# Altium footprint library LimeMicroAltiumLib.PcbLib: 769 footprints (part 17 of 50)
Each footprint in its own frame and in the unit in brackets; x right, y up, seen from the top. Pads: shape width x height; smd on the part's side, far side on the other; paste and mask are expansions set on the pad; w line width, h text height; cw(c..) or ccw(c..) is an arc to the next point about the centre after c.
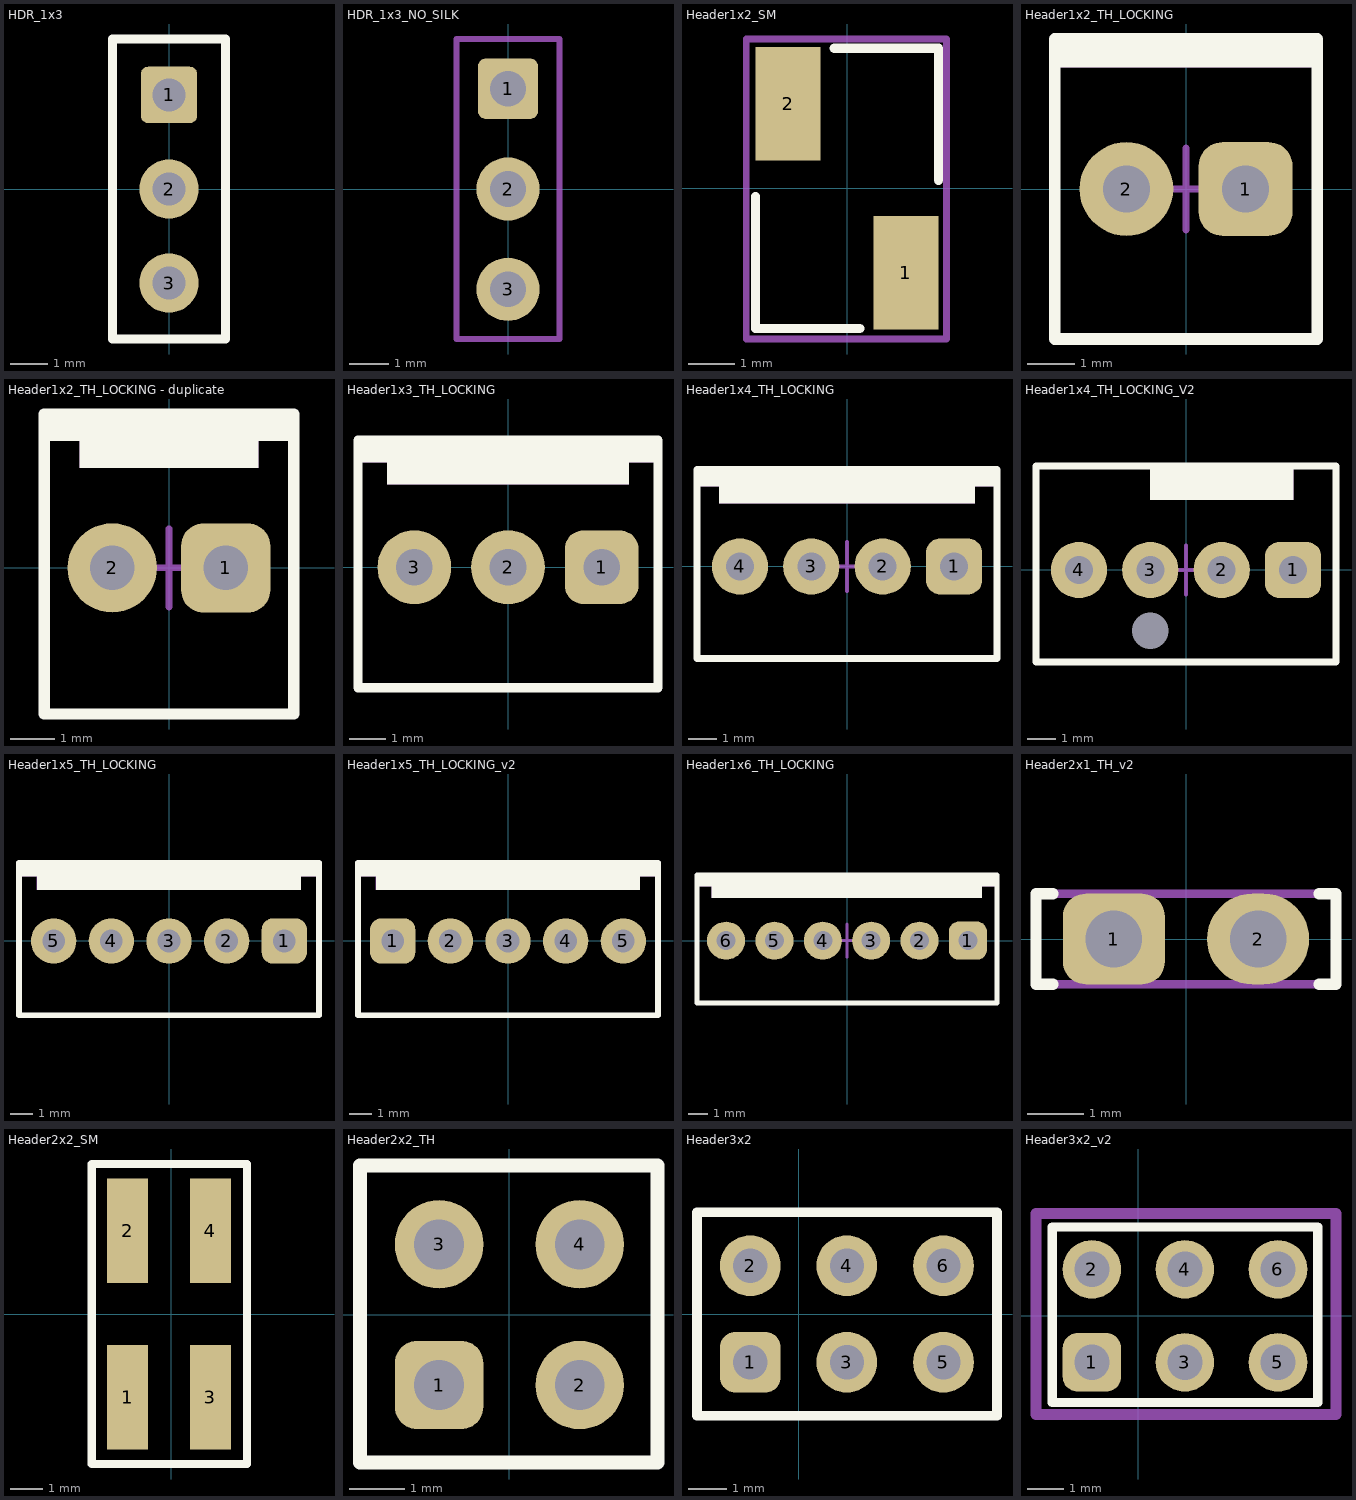
[diagram p16: the footprints below, top view; thin cyan lines are the x and y axes]

## HDR_1x3 [mm]
pads (3):
  rrect25% 1.524x1.524 hole 0.9: 1(0,2.54)
  round 1.6 hole 0.9: 2(0,0) 3(0,-2.54)
Top Overlay:
  lines w0.254: -1.525,-4.05 -1.525,4.05 1.525,4.05 1.525,-4.05 -1.525,-4.05
Mechanical 15:
  lines w0.15: -1.525,-4.05 -1.525,4.05 1.525,4.05 1.525,-4.05 -1.525,-4.05
  text ".Designator" at 0,0 h0.55
3D body "65775.stp": height 8.54, standoff -3, extent -1.27,-3.81 1.27,-1.27
3D body "65775.stp": height 8.54, standoff -3, extent -1.27,-1.27 1.27,1.27
3D body "65775.stp": height 8.54, standoff -3, extent -1.27,1.27 1.27,3.81

## HDR_1x3_NO_SILK [mm]
pads (3):
  rrect25% 1.524x1.524 hole 0.9: 1(0,2.54)
  round 1.6 hole 0.9: 2(0,0) 3(0,-2.54)
Mechanical 15:
  lines w0.15: -1.3,-3.8 1.3,-3.8 1.3,3.8 -1.3,3.8 -1.3,-3.8
  text ".Designator" at 0,0 h0.55
3D body "65775.stp": height 8.54, standoff -3, extent -1.27,1.27 1.27,3.81
3D body "65775.stp": height 8.54, standoff -3, extent -1.27,-1.27 1.27,1.27
3D body "65775.stp": height 8.54, standoff -3, extent -1.27,-3.81 1.27,-1.27

## Header1x2_SM [mm]
pads (2):
  rect 1.4x2.45 smd: 1(1.27,-1.825) 2(-1.27,1.825)
Top Overlay:
  lines w0.2: -1.975,-0.175 -1.975,-3.025 0.275,-3.025 ; -0.275,3.025 1.975,3.025 1.975,0.175
Mechanical 15:
  lines w0.15: -2.175,-3.25 -2.175,3.225 2.15,3.225 2.15,-3.25 -2.175,-3.25
  text ".Designator" at -0.05,0.175 h0.55

## Header1x2_TH_LOCKING [mm]
pads (2):
  rrect50% 2x2 hole 1: 1(1.271,0)
  round 2 hole 1: 2(-1.271,0)
Top Overlay:
  region: -2.8,3.2 -2.8,2.6 2.8,2.6 2.8,3.2
  lines w0.254: -2.8,-3.2 2.8,-3.2 2.8,3.2 -2.8,3.2 -2.8,-3.2
Mechanical 15:
  region: -2.8,3.2 -2.8,2.6 2.8,2.6 2.8,3.2
  lines w0.15: -0.875,0 0,0 ; 0,-0.875 0,0 ; 0,0.875 0,0 ; 0.875,0 0,0 ; -2.8,-3.2 -2.8,3.2 2.8,3.2 2.8,-3.2 -2.8,-3.2
  text ".Designator" at 0,0 h0.55
  text "KEY" at -0.7,1.8 h0.55
  text "1" at 1.125,-1 h0.55
3D body "022292021.stp": height 11.52, standoff -3.74, extent -2.54,-2.9 2.54,2.9

## Header1x2_TH_LOCKING - duplicate [mm]
pads (2):
  rrect50% 2x2 hole 1: 1(1.271,0)
  round 2 hole 1: 2(-1.271,0)
Top Overlay:
  region: 0,2.25 0,2.85 -2,2.85 -2,2.25
  region: 0,2.25 0,2.85 2,2.85 2,2.25
  region: -2.8,3.45 -2.8,2.85 2.8,2.85 2.8,3.45
  lines w0.254: -2.8,-3.275 2.8,-3.275 2.8,3.45 -2.8,3.45 -2.8,-3.275
Mechanical 15:
  region: -2,2.25 -2,2.85 2,2.85 2,2.25
  region: -2.8,3.45 -2.8,2.85 2.8,2.85 2.8,3.45
  lines w0.15: -0.875,0 0,0 ; 0,-0.875 0,0 ; 0,0.875 0,0 ; 0.875,0 0,0 ; -2.8,-3.275 -2.8,3.45 2.8,3.45 2.8,-3.275 -2.8,-3.275
  text ".Designator" at 0,0 h0.55
  text "KEY" at -0.675,1.475 h0.55
  text "1" at 1.125,-1 h0.55
3D body "022292021.stp": height 11.52, standoff -3.74, extent -2.54,-2.9 2.54,2.9

## Header1x3_TH_LOCKING [mm]
pads (3):
  rrect50% 2x2 hole 1: 1(2.543,0)
  round 2 hole 1: 2(0,0) 3(-2.543,0)
Top Overlay:
  region: -4.071,3.45 -4.071,2.85 4.071,2.85 4.071,3.45
  region: 0,2.25 0,2.85 3.271,2.85 3.271,2.25
  region: 0,2.25 0,2.85 -3.271,2.85 -3.271,2.25
  lines w0.254: -4.071,-3.275 -4.071,3.45 4.071,3.45 4.071,-3.275 -4.071,-3.275
Mechanical 15:
  region: 0,2.25 0,2.85 3.271,2.85 3.271,2.25
  region: -4.071,3.45 -4.071,2.85 4.071,2.85 4.071,3.45
  region: 0,2.25 0,2.85 -3.271,2.85 -3.271,2.25
  lines w0.15: -4.071,-3.275 -4.071,3.45 4.071,3.45 4.071,-3.275 -1.529,-3.275 ; -0.875,0 0,0 ; 0,-0.875 0,0 ; 0,0.875 0,0 ; 0.875,0 0,0
  text ".Designator" at 0,0 h0.55
  text "KEY" at -0.7,1.475 h0.55
  text "1" at 2.396,-1 h0.55
3D body "022292021.stp": height 11.52, standoff -3.74, extent -3.811,-2.9 1.269,2.9
3D body "022292021.stp": height 11.52, standoff -3.74, extent -1.268,-2.9 3.812,2.9

## Header1x4_TH_LOCKING [mm]
pads (4):
  rrect50% 2x2 hole 1: 1(3.814,0)
  round 2 hole 1: 2(1.271,0) 3(-1.271,0) 4(-3.814,0)
Top Overlay:
  region: 4.543,2.25 4.543,2.85 -4.554,2.85 -4.554,2.25
  region: -5.343,3.45 -5.343,2.85 5.343,2.85 5.343,3.45
  lines w0.254: -5.343,-3.275 5.343,-3.275 5.343,3.45 -5.343,3.45 -5.343,-3.275
Mechanical 15:
  region: 4.546,2.25 4.546,2.85 -4.554,2.85 -4.554,2.25
  region: -5.343,3.45 -5.343,2.85 5.343,2.85 5.343,3.45
  lines w0.15: -0.875,0 0,0 ; 0,-0.875 0,0 ; 0,0.875 0,0 ; 0.875,0 0,0 ; -5.343,-3.275 5.343,-3.275 5.343,3.45 -5.343,3.45 -5.343,-3.275
  text ".Designator" at 0,0 h0.55
  text "KEY" at -0.7,1.475 h0.55
  text "1" at 3.668,-1 h0.55
3D body "022292021.stp": height 11.52, standoff -3.74, extent 0.003,-2.9 5.083,2.9
3D body "022292021.stp": height 11.52, standoff -3.74, extent -2.54,-2.9 2.54,2.9
3D body "022292021.stp": height 11.52, standoff -3.74, extent -5.083,-2.9 -0.003,2.9

## Header1x4_TH_LOCKING_V2 [mm]
pads (5):
  round 0.25 hole 1.3 unplated mask+0.05: 0(-1.271,-2.16)
  rrect50% 2x2 hole 1: 1(3.814,0)
  round 2 hole 1: 2(1.271,0) 3(-1.271,0) 4(-3.814,0)
Top Overlay:
  region: 3.814,2.5 3.814,3.7 -1.271,3.7 -1.271,2.5
  lines w0.254: -5.343,-3.275 -5.343,3.7 5.343,3.7 5.343,-3.275 -5.343,-3.275
Mechanical 15:
  region: 3.814,2.5 3.814,3.7 -1.271,3.7 -1.271,2.5
  lines w0.15: -0.875,0 0,0 ; 0,-0.875 0,0 ; 0,0.875 0,0 ; 0.875,0 0,0 ; -5.343,-3.275 -5.343,3.7 5.343,3.7 5.343,-3.275 -5.343,-3.275
  text "1" at 3.668,-1 h0.55
  text "KEY" at 0.575,1.725 h0.55
  text ".Designator" at 0,0 h0.55
3D body "470533000.stp": height 9.84, standoff -4, extent -5.1,-2.54 5.1,3.3

## Header1x5_TH_LOCKING [mm]
pads (5):
  rrect50% 2x2 hole 1: 1(5.086,0)
  round 2 hole 1: 2(2.543,0) 3(0,0) 4(-2.543,0) 5(-5.086,0)
Top Overlay:
  region: -6.614,3.45 -6.614,2.85 6.614,2.85 6.614,3.45
  region: 5.814,2.25 5.814,2.85 -5.814,2.85 -5.814,2.25
  lines w0.254: -6.614,-3.275 -6.614,3.45 6.614,3.45 6.614,-3.275 -6.614,-3.275
Mechanical 15:
  region: -6.614,3.45 -6.614,2.85 6.614,2.85 6.614,3.45
  region: 5.818,2.25 5.818,2.85 -5.829,2.85 -5.829,2.25
  lines w0.15: -0.875,0 0,0 ; 0,-0.875 0,0 ; 0,0.875 0,0 ; 0.875,0 0,0 ; -6.614,-3.275 -6.614,3.45 6.614,3.45 6.614,-3.275 -6.614,-3.275
  text "KEY" at -0.779,1.475 h0.55
  text "1" at 4.939,-1 h0.55
  text ".Designator" at 0,0 h0.55
3D body "022292021.stp": height 11.52, standoff -3.74, extent -3.811,-2.9 1.269,2.9
3D body "022292021.stp": height 11.52, standoff -3.74, extent -6.354,-2.9 -1.274,2.9
3D body "022292021.stp": height 11.52, standoff -3.74, extent -1.268,-2.9 3.812,2.9
3D body "022292021.stp": height 11.52, standoff -3.74, extent 1.274,-2.9 6.354,2.9

## Header1x5_TH_LOCKING_v2 [mm]
pads (5):
  rrect50% 2x2 hole 1: 1(-5.086,0)
  round 2 hole 1: 2(-2.543,0) 3(0,0) 4(2.543,0) 5(5.086,0)
Top Overlay:
  region: -6.614,3.45 -6.614,2.85 6.614,2.85 6.614,3.45
  region: 5.814,2.25 5.814,2.85 -5.814,2.85 -5.814,2.25
  lines w0.254: -6.614,-3.275 -6.614,3.45 6.614,3.45 6.614,-3.275 -6.614,-3.275
Mechanical 15:
  region: -6.614,3.45 -6.614,2.85 6.614,2.85 6.614,3.45
  region: 5.818,2.25 5.818,2.85 -5.829,2.85 -5.829,2.25
  lines w0.15: -0.875,0 0,0 ; 0,-0.875 0,0 ; 0,0.875 0,0 ; 0.875,0 0,0 ; -6.614,-3.275 -6.614,3.45 6.614,3.45 6.614,-3.275 -6.614,-3.275
  text "KEY" at -0.779,1.475 h0.55
  text "1" at -5.2,-0.2 h0.55
  text ".Designator" at 0,0 h0.55
3D body "022292021.stp": height 11.52, standoff -3.74, extent -3.811,-2.9 1.269,2.9
3D body "022292021.stp": height 11.52, standoff -3.74, extent -6.354,-2.9 -1.274,2.9
3D body "022292021.stp": height 11.52, standoff -3.74, extent -1.268,-2.9 3.812,2.9
3D body "022292021.stp": height 11.52, standoff -3.74, extent 1.274,-2.9 6.354,2.9

## Header1x6_TH_LOCKING [mm]
pads (6):
  rrect50% 2x2 hole 1: 1(6.357,0)
  round 2 hole 1: 2(3.814,0) 3(1.271,0) 4(-1.271,0) 5(-3.814,0) 6(-6.357,0)
Top Overlay:
  region: 7.086,2.25 7.086,2.85 -7.104,2.85 -7.104,2.25
  region: -7.886,3.45 -7.886,2.85 7.886,2.85 7.886,3.45
  lines w0.254: -7.886,-3.275 -7.886,3.45 7.886,3.45 7.886,-3.275 -7.886,-3.275
Mechanical 15:
  region: 7.089,2.25 7.089,2.85 -7.104,2.85 -7.104,2.25
  region: -7.886,3.45 -7.886,2.85 7.886,2.85 7.886,3.45
  lines w0.15: -0.875,0 0,0 ; 0,-0.875 0,0 ; 0,0.875 0,0 ; 0.875,0 0,0 ; -7.886,-3.275 -7.886,3.45 7.886,3.45 7.886,-3.275 -7.886,-3.275
  text "KEY" at -0.779,1.475 h0.55
  text ".Designator" at 0,0 h0.55
  text "1" at 6.211,-1 h0.55
3D body "022292021.stp": height 11.52, standoff -3.74, extent -7.626,-2.9 -2.546,2.9
3D body "022292021.stp": height 11.52, standoff -3.74, extent 2.546,-2.9 7.626,2.9
3D body "022292021.stp": height 11.52, standoff -3.74, extent 0.003,-2.9 5.083,2.9
3D body "022292021.stp": height 11.52, standoff -3.74, extent -5.083,-2.9 -0.003,2.9
3D body "022292021.stp": height 11.52, standoff -3.74, extent -2.54,-2.9 2.54,2.9

## Header2x1_TH_v2 [mm]
pads (2):
  rrect50% 1.8x1.6 hole 1: 1(-1.271,0)
  oval 1.8x1.6 hole 1: 2(1.271,0)
Top Overlay:
  lines w0.2: -2.343,-0.8 -2.643,-0.8 -2.643,0.8 -2.343,0.8 ; 2.343,-0.8 2.643,-0.8 2.643,0.8 2.343,0.8
Mechanical 15:
  lines w0.15: -2.643,-0.8 -2.643,0.8 2.643,0.8 2.643,-0.8 -2.643,-0.8
  text ".Designator" at 0.014,0 h0.55

## Header2x2_SM [mm]
pads (4):
  rect 1.27x3.2 smd: 1(-1.336,-2.55) 2(-1.336,2.55) 3(1.207,-2.55) 4(1.207,2.55)
Top Overlay:
  lines w0.254: -2.436,-4.6 2.325,-4.6 2.325,4.6 -2.436,4.6 -2.436,-4.6
Mechanical 15:
  lines w0.15: -2.425,-4.6 2.325,-4.6 2.325,4.575 -2.425,4.575 -2.425,-4.6
  text ".Designator" at -1.4,-0.1 h0.55
3D body "pin_header_a-sl254-dg-g04mp1.stp": height 9.7, standoff -0.04, extent -2.54,-3.7 2.54,3.8

## Header2x2_TH [mm]
pads (4):
  rrect50% 1.6x1.6 hole 0.9: 1(-1.271,-1.271)
  round 1.6 hole 0.9: 2(1.271,-1.271) 3(-1.271,1.271) 4(1.271,1.271)
Top Overlay:
  lines w0.254: -2.7,-2.675 -2.7,2.7 2.675,2.7 2.675,-2.675 -2.7,-2.675
Mechanical 15:
  lines w0.15: -2.725,-2.7 2.675,-2.7 2.675,2.725 -2.725,2.725 -2.725,-2.7
  text ".Designator" at 0,0 h0.55
3D body "65775.stp": height 8.54, standoff -3, extent -2.541,0.002 -0.001,2.542
3D body "65775.stp": height 8.54, standoff -3, extent 0.001,0.002 2.541,2.542
3D body "65775.stp": height 8.54, standoff -3, extent -2.541,-2.541 -0.001,-0.001
3D body "65775.stp": height 8.54, standoff -3, extent 0.001,-2.541 2.541,-0.001

## Header3x2 [mm]
pads (6):
  rrect50% 1.6x1.6 hole 0.9: 1(-1.271,-1.271)
  round 1.6 hole 0.9: 2(-1.271,1.271) 3(1.271,-1.271) 4(1.271,1.271) 5(3.814,-1.271) 6(3.814,1.271)
Top Overlay:
  lines w0.254: -2.675,-2.675 -2.675,2.675 5.225,2.675 5.225,-2.675 -2.675,-2.675
Mechanical 15:
  lines w0.15: -2.675,-2.675 5.225,-2.675 5.225,2.675 -2.675,2.675 -2.675,-2.675
  text ".Designator" at 0,0 h0.55
3D body "65775.stp": height 8.54, standoff -3, extent -2.541,0.002 -0.001,2.542
3D body "65775.stp": height 8.54, standoff -3, extent 0.001,0.002 2.541,2.542
3D body "65775.stp": height 8.54, standoff -3, extent 2.544,0.002 5.084,2.542
3D body "65775.stp": height 8.54, standoff -3, extent 2.544,-2.541 5.084,-0.001
3D body "65775.stp": height 8.54, standoff -3, extent 0.001,-2.541 2.541,-0.001
3D body "65775.stp": height 8.54, standoff -3, extent -2.541,-2.541 -0.001,-0.001

## Header3x2_v2 [mm]
pads (6):
  rrect50% 1.6x1.6 hole 0.965: 1(-1.271,-1.271)
  round 1.6 hole 0.965: 2(-1.271,1.271) 3(1.271,-1.271) 4(1.271,1.271) 5(3.814,-1.271) 6(3.814,1.271)
Top Overlay:
  lines w0.254: -2.357,-2.371 4.9,-2.371 4.9,2.429 -2.357,2.429 -2.357,-2.371
Mechanical 15:
  lines w0.3: -2.8,-2.7 -2.8,2.8 5.4,2.8 5.4,-2.7 -2.8,-2.7
  text ".Designator" at 0,0 h0.7
3D body "PinHeaderMating 1P.stp": height 6.78, standoff -3, extent -0.188,-2.541 2.732,-0.001
3D body "PinHeaderMating 1P.stp": height 6.78, standoff -3, extent -2.731,-2.541 0.189,-0.001
3D body "PinHeaderMating 1P.stp": height 6.78, standoff -3, extent -0.188,0.001 2.732,2.541
3D body "PinHeaderMating 1P.stp": height 6.78, standoff -3, extent -2.731,0.001 0.189,2.541